# Altium schematic symbol library FPGA_Xilinx_Virtex7.SchLib: 34 symbols (part 15 of 26)
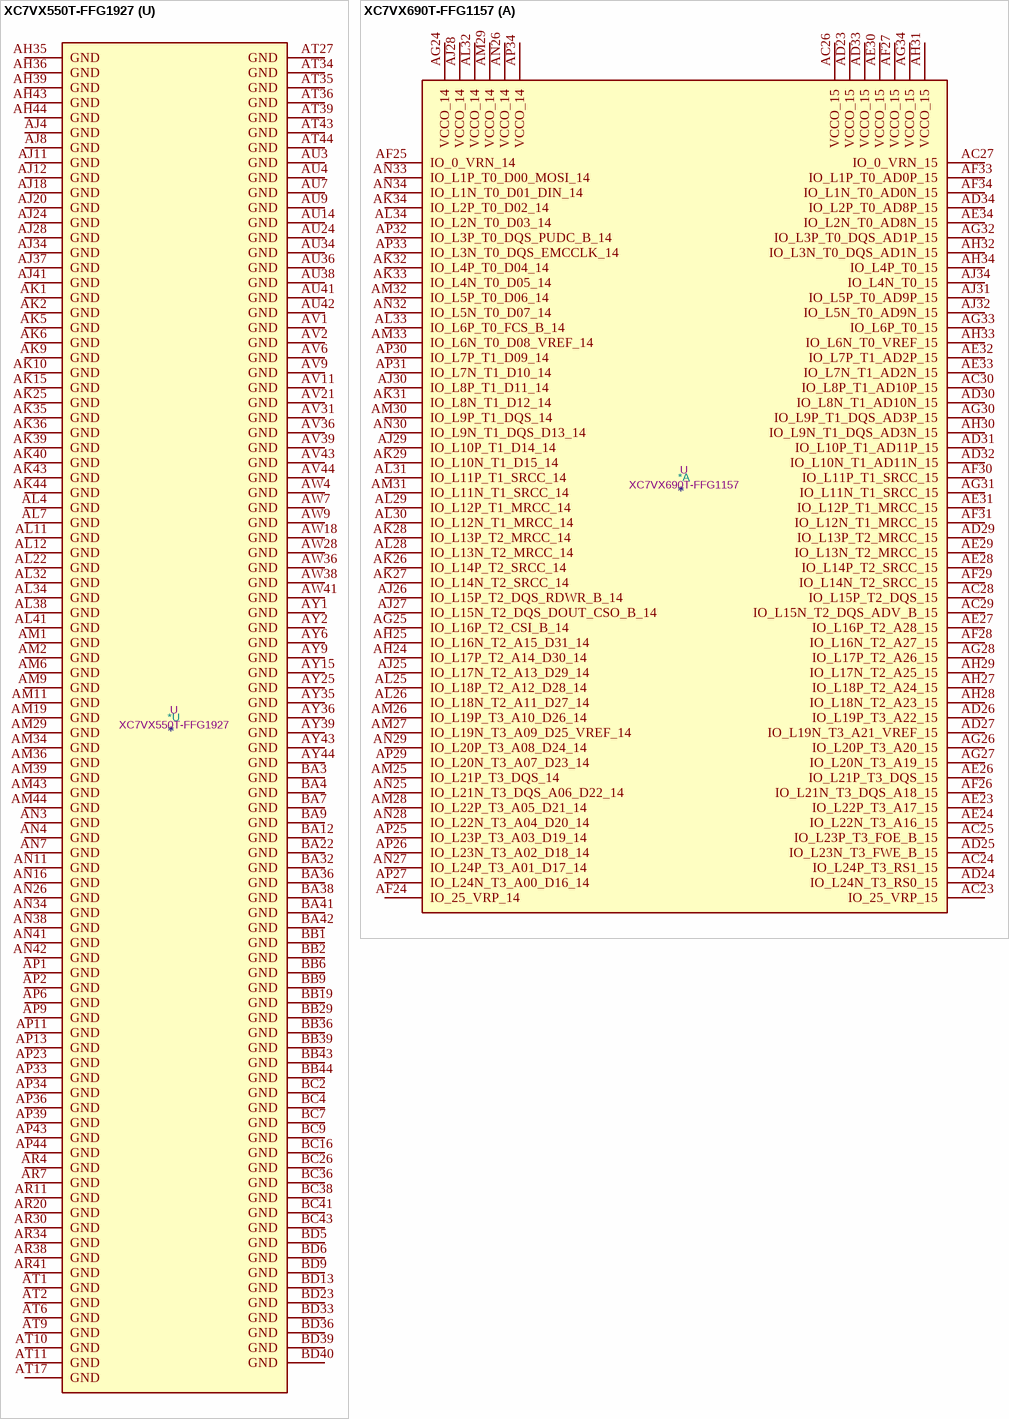
[diagram p186: symbols XC7VX550T-FFG1927 to XC7VX690T-FFG1157]

## XC7VX550T-FFG1927
designator *  value XC7VX550T-FFG1927  Reference: U
ki_keywords: FPGA; ki_description: Virtex 7 XT 550 XC7VX550T-FFG1927
part A pins: AJ23 VCCO_15, AJ25 IO_L24P_T3_RS1_15, AJ26 IO_L24N_T3_RS0_15, AJ29 IO_L23P_T3_A03_D19_14, AK23 IO_L21P_T3_DQS_15, AK24 IO_L21N_T3_DQS_A18_15, AK26 IO_L22P_T3_A17_15, AK27 IO_L21P_T3_DQS_14, AK28 IO_L21N_T3_DQS_A06_D22_14, AK29 IO_L23N_T3_A02_D18_14, AL23 IO_L19P_T3_A22_15, AL24 IO_L23P_T3_FOE_B_15, AL25 IO_L23N_T3_FWE_B_15, AL26 IO_L22N_T3_A16_15, AL27 VCCO_14, AL28 IO_L24P_T3_A01_D17_14, AL29 IO_L24N_T3_A00_D16_14, AM23 IO_L19N_T3_A21_VREF_15, AM24 VCCO_15, AM25 IO_L20P_T3_A20_15, AM26 IO_L20N_T3_A19_15, AM27 IO_L22P_T3_A05_D21_14, AM28 IO_L22N_T3_A04_D20_14, AM30 IO_L20P_T3_A08_D24_14, AN23 IO_L15P_T2_DQS_15, AN24 IO_L15N_T2_DQS_ADV_B_15, AN25 IO_L18P_T2_A24_15, AN27 IO_L15P_T2_DQS_RDWR_B_14, AN28 IO_L19P_T3_A10_D26_14, AN29 IO_L19N_T3_A09_D25_VREF_14, AN30 IO_L20N_T3_A07_D23_14, AP24 IO_L17P_T2_A26_15, AP25 IO_L17N_T2_A25_15, AP26 IO_L18N_T2_A23_15, AP27 IO_L15N_T2_DQS_DOUT_CSO_B_14, AP28 VCCO_14, AP29 IO_L17P_T2_A14_D30_14, AP30 IO_L17N_T2_A13_D29_14, AR24 IO_0_VRN_15, AR25 VCCO_15, AR26 IO_25_VRP_15, AR27 IO_25_VRP_14, AR28 IO_L18P_T2_A12_D28_14, AR29 IO_L18N_T2_A11_D27_14, AT23 IO_L13P_T2_MRCC_15, AT24 IO_L14P_T2_SRCC_15, AT25 IO_L14N_T2_SRCC_15, AT26 IO_L16P_T2_A28_15, AT28 IO_L16P_T2_CSI_B_14, AT29 IO_L16N_T2_A15_D31_14, AT30 IO_0_VRN_14, AU23 IO_L13N_T2_MRCC_15, AU25 IO_L12P_T1_MRCC_15, AU26 IO_L12N_T1_MRCC_15, AU27 IO_L16N_T2_A27_15, AU28 IO_L14P_T2_SRCC_14, AU29 VCCO_14, AU30 IO_L13P_T2_MRCC_14, AV23 IO_L11P_T1_SRCC_15, AV24 IO_L11N_T1_SRCC_15, AV25 IO_L9P_T1_DQS_AD3P_15, AV26 VCCO_15, AV27 IO_L12P_T1_MRCC_14, AV28 IO_L12N_T1_MRCC_14, AV29 IO_L14N_T2_SRCC_14, AV30 IO_L13N_T2_MRCC_14, AW23 VCCO_15, AW24 IO_L10P_T1_AD11P_15, AW25 IO_L9N_T1_DQS_AD3N_15, AW26 IO_L7P_T1_AD2P_15, AW27 IO_L8P_T1_D11_14, AW29 IO_L7P_T1_D09_14, AW30 IO_L11P_T1_SRCC_14, AW31 IO_L11N_T1_SRCC_14, AY23 IO_L8P_T1_AD10P_15, AY24 IO_L10N_T1_AD11N_15, AY26 IO_L7N_T1_AD2N_15, AY27 IO_L8N_T1_D12_14, AY28 IO_L10P_T1_D14_14, AY29 IO_L7N_T1_D10_14, AY30 VCCO_14, AY31 IO_L9P_T1_DQS_14, BA23 IO_L8N_T1_AD10N_15, BA24 IO_L6P_T0_15, BA25 IO_L6N_T0_VREF_15, BA26 IO_L5P_T0_AD9P_15, BA27 VCCO_14, BA28 IO_L10N_T1_D15_14, BA29 IO_L6P_T0_FCS_B_14, BA30 IO_L6N_T0_D08_VREF_14, BA31 IO_L9N_T1_DQS_D13_14, BB23 IO_L2P_T0_AD8P_15, BB24 VCCO_15, BB25 IO_L3P_T0_DQS_AD1P_15, BB26 IO_L5N_T0_AD9N_15, BB27 IO_L3P_T0_DQS_PUDC_B_14, BB28 IO_L3N_T0_DQS_EMCCLK_14, BB30 IO_L4P_T0_D04_14, BC23 IO_L2N_T0_AD8N_15, BC24 IO_L4P_T0_15, BC25 IO_L3N_T0_DQS_AD1N_15, BC27 IO_L1P_T0_D00_MOSI_14, BC28 IO_L5P_T0_D06_14, BC29 IO_L5N_T0_D07_14, BC30 IO_L4N_T0_D05_14, BD24 IO_L4N_T0_15, BD25 IO_L1P_T0_AD0P_15, BD26 IO_L1N_T0_AD0N_15, BD27 IO_L1N_T0_D01_DIN_14, BD28 VCCO_14, BD29 IO_L2P_T0_D02_14, BD30 IO_L2N_T0_D03_14
part B pins: A23 IO_L1N_T0_17, A24 IO_L4P_T0_17, A25 IO_L4N_T0_17, AJ30 IO_L2P_T0_16, AJ31 IO_L2N_T0_16, AJ32 IO_L4P_T0_16, AK30 VCCO_16, AK31 IO_L3P_T0_DQS_16, AK32 IO_L4N_T0_16, AK33 IO_L1P_T0_16, AL30 IO_L5P_T0_16, AL31 IO_L3N_T0_DQS_16, AL33 IO_L1N_T0_16, AM31 IO_L5N_T0_16, AM32 IO_L6P_T0_16, AM33 IO_L6N_T0_VREF_16, AN31 VCCO_16, AN32 IO_L7P_T1_16, AN33 IO_L7N_T1_16, AP31 IO_L9P_T1_DQS_16, AP32 IO_L9N_T1_DQS_16, AR31 IO_L10P_T1_16, AR32 IO_L10N_T1_16, AR33 IO_L8P_T1_16, AT31 IO_25_VRP_16, AT32 VCCO_16, AT33 IO_L8N_T1_16, AU31 IO_L11P_T1_SRCC_16, AU32 IO_L11N_T1_SRCC_16, AU33 IO_L12P_T1_MRCC_16, AU35 IO_0_VRN_16, AV32 IO_L13P_T2_MRCC_16, AV33 IO_L12N_T1_MRCC_16, AV34 IO_L14P_T2_SRCC_16, AV35 IO_L14N_T2_SRCC_16, AW32 IO_L13N_T2_MRCC_16, AW33 VCCO_16, AW34 IO_L15P_T2_DQS_16, AW35 IO_L15N_T2_DQS_16, AY32 IO_L18P_T2_16, AY33 IO_L16P_T2_16, AY34 IO_L16N_T2_16, B23 IO_L1P_T0_17, B24 VCCO_17, B25 IO_L2N_T0_17, BA33 IO_L18N_T2_16, BA34 IO_L17P_T2_16, BA35 IO_L17N_T2_16, BB31 IO_L19P_T3_16, BB32 IO_L19N_T3_VREF_16, BB33 IO_L22P_T3_16, BB34 VCCO_16, BB35 IO_L20P_T3_16, BC31 VCCO_16, BC32 IO_L21P_T3_DQS_16, BC33 IO_L21N_T3_DQS_16, BC34 IO_L22N_T3_16, BC35 IO_L20N_T3_16, BD31 IO_L23P_T3_16, BD32 IO_L23N_T3_16, BD34 IO_L24P_T3_16, BD35 IO_L24N_T3_16, C23 IO_L3P_T0_DQS_17, C24 IO_L3N_T0_DQS_17, C25 IO_L2P_T0_17, D24 IO_L5P_T0_17, D25 IO_L5N_T0_17, E23 IO_L6P_T0_17, E24 IO_L6N_T0_VREF_17, E25 VCCO_17, F23 IO_L7N_T1_17, F24 IO_L8P_T1_17, F25 IO_L8N_T1_17, G23 IO_L7P_T1_17, G25 IO_L10P_T1_17, G26 IO_L10N_T1_17, H23 IO_L9P_T1_DQS_17, H24 IO_L9N_T1_DQS_17, H25 IO_L11N_T1_SRCC_17, H26 VCCO_17, J23 VCCO_17, J24 IO_L11P_T1_SRCC_17, J25 IO_L12P_T1_MRCC_17, J26 IO_L12N_T1_MRCC_17, K23 IO_L13P_T2_MRCC_17, K24 IO_L13N_T2_MRCC_17, K26 IO_L15N_T2_DQS_17, L23 IO_L18N_T2_17, L24 IO_L14P_T2_SRCC_17, L25 IO_L14N_T2_SRCC_17, L26 IO_L15P_T2_DQS_17, M23 IO_L18P_T2_17, M24 VCCO_17, M25 IO_L17N_T2_17, M26 IO_0_VRN_17, N23 IO_L16P_T2_17, N24 IO_L16N_T2_17, N25 IO_L17P_T2_17, P24 IO_25_VRP_17, P25 IO_L20P_T3_17, P26 IO_L20N_T3_17, R23 IO_L24P_T3_17, R24 IO_L24N_T3_17, R25 VCCO_17, R26 IO_L22N_T3_17, T23 IO_L23N_T3_17, T24 IO_L19P_T3_17, T25 IO_L19N_T3_VREF_17, T26 IO_L22P_T3_17, U23 IO_L23P_T3_17, U25 IO_L21P_T3_DQS_17, U26 IO_L21N_T3_DQS_17
part C pins: A26 IO_L5N_T0_19, A27 VCCO_19, A28 IO_L1P_T0_19, A29 IO_L1N_T0_19, A30 IO_L3P_T0_DQS_18, A31 IO_L3N_T0_DQS_18, A33 IO_L2N_T0_18, B26 IO_L5P_T0_19, B27 IO_L3N_T0_DQS_19, B28 IO_L4N_T0_19, B30 IO_L1N_T0_18, B31 IO_L5P_T0_18, B32 IO_L5N_T0_18, B33 IO_L2P_T0_18, C27 IO_L3P_T0_DQS_19, C28 IO_L4P_T0_19, C29 IO_L2N_T0_19, C30 IO_L1P_T0_18, C31 VCCO_18, C32 IO_L4P_T0_18, C33 IO_L4N_T0_18, D26 IO_L6P_T0_19, D27 IO_L6N_T0_VREF_19, D28 VCCO_19, D29 IO_L2P_T0_19, D30 IO_L6P_T0_18, D31 IO_L6N_T0_VREF_18, D32 IO_L7N_T1_18, E26 IO_L8N_T1_19, E27 IO_L10P_T1_19, E28 IO_L10N_T1_19, E29 IO_L9N_T1_DQS_19, E31 IO_L7P_T1_18, E32 IO_L8P_T1_18, E33 IO_L8N_T1_18, F26 IO_L8P_T1_19, F28 IO_L7N_T1_19, F29 IO_L9P_T1_DQS_19, F30 IO_L9P_T1_DQS_18, F31 IO_L9N_T1_DQS_18, F32 VCCO_18, F33 IO_L10N_T1_18, G27 IO_L11N_T1_SRCC_19, G28 IO_L7P_T1_19, G29 VCCO_19, G30 IO_L12N_T1_MRCC_18, G31 IO_L11P_T1_SRCC_18, G32 IO_L11N_T1_SRCC_18, G33 IO_L10P_T1_18, H27 IO_L11P_T1_SRCC_19, H28 IO_L12P_T1_MRCC_19, H29 IO_L12N_T1_MRCC_19, H30 IO_L12P_T1_MRCC_18, H32 IO_L13P_T2_MRCC_18, H33 IO_L13N_T2_MRCC_18, J27 IO_L13N_T2_MRCC_19, J29 IO_L14N_T2_SRCC_19, J30 IO_L14P_T2_SRCC_18, J31 IO_L14N_T2_SRCC_18, J32 IO_L16N_T2_18, J33 VCCO_18, K27 IO_L13P_T2_MRCC_19, K28 IO_L14P_T2_SRCC_19, K29 IO_L16N_T2_19, K30 VCCO_18, K31 IO_L15N_T2_DQS_18, K32 IO_L16P_T2_18, K33 IO_L18N_T2_18, L27 VCCO_19, L28 IO_L16P_T2_19, L29 IO_L18N_T2_19, L30 IO_0_VRN_18, L31 IO_L15P_T2_DQS_18, L33 IO_L18P_T2_18, M27 IO_0_VRN_19, M28 IO_L18P_T2_19, M30 IO_L15N_T2_DQS_19, M31 IO_L17P_T2_18, M32 IO_L17N_T2_18, M33 IO_L20N_T3_18, N27 IO_25_VRP_19, N28 IO_L17P_T2_19, N29 IO_L17N_T2_19, N30 IO_L15P_T2_DQS_19, N31 VCCO_18, N32 IO_L22N_T3_18, N33 IO_L20P_T3_18, P27 IO_L23N_T3_19, P28 VCCO_19, P29 IO_L19P_T3_19, P30 IO_L19N_T3_VREF_19, P31 IO_L22P_T3_18, P32 IO_L19N_T3_VREF_18, R27 IO_L23P_T3_19, R28 IO_L21P_T3_DQS_19, R29 IO_L21N_T3_DQS_19, R31 IO_L21N_T3_DQS_18, R32 IO_L19P_T3_18, R33 IO_L24N_T3_18, T28 IO_L20P_T3_19, T29 IO_L20N_T3_19, T30 IO_L22N_T3_19, T31 IO_L21P_T3_DQS_18, T32 VCCO_18, T33 IO_L24P_T3_18, U27 IO_L24P_T3_19, U28 IO_L24N_T3_19, U29 VCCO_19, U30 IO_L22P_T3_19, U31 IO_25_VRP_18, U32 IO_L23P_T3_18, U33 IO_L23N_T3_18
part D pins: AJ16 IO_L23P_T3_34, AJ21 IO_L20N_T3_35, AJ22 IO_L20P_T3_35, AK16 IO_L23N_T3_34, AK17 IO_25_VRP_34, AK18 IO_L21P_T3_DQS_34, AK19 IO_L24P_T3_35, AK20 VCCO_35, AK21 IO_L22N_T3_35, AK22 IO_L22P_T3_35, AL15 IO_L24N_T3_34, AL16 IO_L24P_T3_34, AL17 VCCO_34, AL18 IO_L21N_T3_DQS_34, AL19 IO_L24N_T3_35, AL20 IO_L23N_T3_35, AL21 IO_L23P_T3_35, AM15 IO_L20P_T3_34, AM16 IO_L22N_T3_34, AM17 IO_L22P_T3_34, AM18 IO_L19P_T3_34, AM20 IO_L21P_T3_DQS_35, AM21 IO_L19N_T3_VREF_35, AM22 IO_L19P_T3_35, AN15 IO_L20N_T3_34, AN17 IO_L18P_T2_34, AN18 IO_L19N_T3_VREF_34, AN19 IO_L21N_T3_DQS_35, AN20 IO_L17P_T2_35, AN21 VCCO_35, AN22 IO_L18P_T2_35, AP15 IO_0_VRN_34, AP16 IO_L15P_T2_DQS_34, AP17 IO_L18N_T2_34, AP18 VCCO_34, AP19 IO_L17N_T2_35, AP20 IO_L15N_T2_DQS_35, AP21 IO_L15P_T2_DQS_35, AP22 IO_L18N_T2_35, AR15 VCCO_34, AR16 IO_L15N_T2_DQS_34, AR17 IO_L16N_T2_34, AR18 IO_L16P_T2_34, AR19 IO_25_VRP_35, AR21 IO_L16N_T2_35, AR22 IO_L16P_T2_35, AR23 IO_0_VRN_35, AT15 IO_L17N_T2_34, AT16 IO_L17P_T2_34, AT18 IO_L13P_T2_MRCC_34, AT19 IO_L14N_T2_SRCC_35, AT20 IO_L14P_T2_SRCC_35, AT21 IO_L13P_T2_MRCC_35, AT22 VCCO_35, AU15 IO_L12P_T1_MRCC_34, AU16 IO_L14N_T2_SRCC_34, AU17 IO_L14P_T2_SRCC_34, AU18 IO_L13N_T2_MRCC_34, AU19 VCCO_35, AU20 IO_L12P_T1_MRCC_35, AU21 IO_L13N_T2_MRCC_35, AU22 IO_L11P_T1_SRCC_35, AV15 IO_L12N_T1_MRCC_34, AV16 VCCO_34, AV17 IO_L11N_T1_SRCC_34, AV18 IO_L11P_T1_SRCC_34, AV19 IO_L12N_T1_MRCC_35, AV20 IO_L8P_T1_AD14P_35, AV22 IO_L11N_T1_SRCC_35, AW15 IO_L9N_T1_DQS_34, AW16 IO_L9P_T1_DQS_34, AW17 IO_L7P_T1_34, AW19 IO_L10P_T1_AD15P_35, AW20 IO_L8N_T1_AD14N_35, AW21 IO_L9P_T1_DQS_AD7P_35, AW22 IO_L7P_T1_AD6P_35, AY16 IO_L7N_T1_34, AY17 IO_L8N_T1_34, AY18 IO_L8P_T1_34, AY19 IO_L10N_T1_AD15N_35, AY20 VCCO_35, AY21 IO_L9N_T1_DQS_AD7N_35, AY22 IO_L7N_T1_AD6N_35, BA15 IO_L10N_T1_34, BA16 IO_L10P_T1_34, BA17 VCCO_34, BA18 IO_L1P_T0_34, BA19 IO_L6N_T0_VREF_35, BA20 IO_L6P_T0_35, BA21 IO_L5P_T0_AD13P_35, BB15 IO_L6N_T0_VREF_34, BB16 IO_L6P_T0_34, BB17 IO_L3P_T0_DQS_34, BB18 IO_L1N_T0_34, BB20 IO_L5N_T0_AD13N_35, BB21 IO_L1N_T0_AD4N_35, BB22 IO_L1P_T0_AD4P_35, BC15 IO_L5P_T0_34, BC17 IO_L3N_T0_DQS_34, BC18 IO_L2N_T0_34, BC19 IO_L2P_T0_34, BC20 IO_L3P_T0_DQS_AD5P_35, BC21 VCCO_35, BC22 IO_L2P_T0_AD12P_35, BD15 IO_L5N_T0_34, BD16 IO_L4N_T0_34, BD17 IO_L4P_T0_34, BD18 VCCO_34, BD19 IO_L3N_T0_DQS_AD5N_35, BD20 IO_L4N_T0_35, BD21 IO_L4P_T0_35, BD22 IO_L2N_T0_AD12N_35
part E pins: A20 IO_L2N_T0_37, A21 IO_L1N_T0_37, AJ13 VCCO_36, AJ14 IO_L1P_T0_36, AK12 IO_L3N_T0_DQS_36, AK13 IO_L3P_T0_DQS_36, AK14 IO_L1N_T0_36, AL13 IO_L5N_T0_36, AL14 IO_L5P_T0_36, AM12 IO_L2N_T0_36, AM13 IO_L2P_T0_36, AM14 VCCO_36, AN12 IO_L4N_T0_36, AN13 IO_L4P_T0_36, AN14 IO_L6P_T0_36, AP12 IO_0_VRN_36, AP14 IO_L6N_T0_VREF_36, AR12 IO_L7N_T1_36, AR13 IO_L7P_T1_36, AR14 IO_25_VRP_36, AT12 VCCO_36, AT13 IO_L9N_T1_DQS_36, AT14 IO_L9P_T1_DQS_36, AU10 IO_L10P_T1_36, AU11 IO_L8N_T1_36, AU12 IO_L8P_T1_36, AU13 IO_L12P_T1_MRCC_36, AV10 IO_L10N_T1_36, AV12 IO_L11P_T1_SRCC_36, AV13 IO_L12N_T1_MRCC_36, AV14 IO_L13P_T2_MRCC_36, AW10 IO_L14N_T2_SRCC_36, AW11 IO_L14P_T2_SRCC_36, AW12 IO_L11N_T1_SRCC_36, AW13 VCCO_36, AW14 IO_L13N_T2_MRCC_36, AY10 VCCO_36, AY11 IO_L16N_T2_36, AY12 IO_L16P_T2_36, AY13 IO_L15P_T2_DQS_36, AY14 IO_L18P_T2_36, B20 IO_L2P_T0_37, B21 IO_L1P_T0_37, B22 IO_L3N_T0_DQS_37, BA10 IO_L17N_T2_36, BA11 IO_L17P_T2_36, BA13 IO_L15N_T2_DQS_36, BA14 IO_L18N_T2_36, BB10 IO_L19N_T3_VREF_36, BB11 IO_L19P_T3_36, BB12 IO_L20P_T3_36, BB13 IO_L22P_T3_36, BB14 VCCO_36, BC10 IO_L24P_T3_36, BC11 VCCO_36, BC12 IO_L20N_T3_36, BC13 IO_L22N_T3_36, BC14 IO_L23P_T3_36, BD10 IO_L24N_T3_36, BD11 IO_L21N_T3_DQS_36, BD12 IO_L21P_T3_DQS_36, BD14 IO_L23N_T3_36, C20 IO_L4N_T0_37, C21 VCCO_37, C22 IO_L3P_T0_DQS_37, D20 IO_L4P_T0_37, D21 IO_L5N_T0_37, D22 IO_L5P_T0_37, E21 IO_L6N_T0_VREF_37, E22 IO_L6P_T0_37, F19 IO_L8N_T1_37, F20 IO_L8P_T1_37, F21 IO_L7N_T1_37, F22 VCCO_37, G19 VCCO_37, G20 IO_L12N_T1_MRCC_37, G21 IO_L7P_T1_37, G22 IO_L9N_T1_DQS_37, H19 IO_L10N_T1_37, H20 IO_L12P_T1_MRCC_37, H22 IO_L9P_T1_DQS_37, J19 IO_L10P_T1_37, J20 IO_L11N_T1_SRCC_37, J21 IO_L11P_T1_SRCC_37, J22 IO_L13N_T2_MRCC_37, K19 IO_L15N_T2_DQS_37, K20 VCCO_37, K21 IO_L14N_T2_SRCC_37, K22 IO_L13P_T2_MRCC_37, L19 IO_L15P_T2_DQS_37, L20 IO_L16N_T2_37, L21 IO_L14P_T2_SRCC_37, M20 IO_L16P_T2_37, M21 IO_25_VRP_37, M22 IO_L18N_T2_37, N19 IO_L17N_T2_37, N20 IO_L17P_T2_37, N21 VCCO_37, N22 IO_L18P_T2_37, P19 IO_0_VRN_37, P20 IO_L22N_T3_37, P21 IO_L22P_T3_37, P22 IO_L23N_T3_37, R19 IO_L20N_T3_37, R21 IO_L24N_T3_37, R22 IO_L23P_T3_37, T19 IO_L20P_T3_37, T20 IO_L19N_T3_VREF_37, T21 IO_L24P_T3_37, T22 VCCO_37, U19 VCCO_37, U20 IO_L19P_T3_37, U21 IO_L21N_T3_DQS_37, U22 IO_L21P_T3_DQS_37
part F pins: A13 IO_L4N_T0_38, A14 IO_L4P_T0_38, A15 IO_L2N_T0_38, A16 IO_L2N_T0_39, A17 VCCO_39, A18 IO_L5N_T0_39, A19 IO_L5P_T0_39, B12 IO_L3N_T0_DQS_38, B13 IO_L3P_T0_DQS_38, B14 VCCO_38, B15 IO_L2P_T0_38, B16 IO_L2P_T0_39, B17 IO_L4N_T0_39, B18 IO_L1N_T0_39, C12 IO_L5N_T0_38, C13 IO_L5P_T0_38, C14 IO_L1N_T0_38, C15 IO_L1P_T0_38, C17 IO_L4P_T0_39, C18 IO_L1P_T0_39, C19 IO_L3N_T0_DQS_39, D12 IO_L7N_T1_38, D14 IO_L6N_T0_VREF_38, D15 IO_L6P_T0_38, D16 IO_L6N_T0_VREF_39, D17 IO_L6P_T0_39, D18 VCCO_39, D19 IO_L3P_T0_DQS_39, E12 IO_L7P_T1_38, E13 IO_L8N_T1_38, E14 IO_L8P_T1_38, E15 VCCO_38, E16 IO_L7N_T1_39, E17 IO_L7P_T1_39, E18 IO_L10N_T1_39, E19 IO_L10P_T1_39, F12 VCCO_38, F13 IO_L10N_T1_38, F14 IO_L10P_T1_38, F15 IO_L9N_T1_DQS_38, F16 IO_L9N_T1_DQS_39, F18 IO_L8N_T1_39, G12 IO_L15N_T2_DQS_38, G13 IO_L11N_T1_SRCC_38, G15 IO_L9P_T1_DQS_38, G16 IO_L9P_T1_DQS_39, G17 IO_L12N_T1_MRCC_39, G18 IO_L8P_T1_39, H12 IO_L15P_T2_DQS_38, H13 IO_L11P_T1_SRCC_38, H14 IO_L12N_T1_MRCC_38, H15 IO_L12P_T1_MRCC_38, H16 VCCO_39, H17 IO_L11N_T1_SRCC_39, H18 IO_L12P_T1_MRCC_39, J12 IO_L18N_T2_38, J13 VCCO_38, J14 IO_L13N_T2_MRCC_38, J15 IO_L13P_T2_MRCC_38, J16 IO_L13N_T2_MRCC_39, J17 IO_L11P_T1_SRCC_39, K12 IO_L18P_T2_38, K13 IO_L14N_T2_SRCC_38, K14 IO_L14P_T2_SRCC_38, K16 IO_L14N_T2_SRCC_39, K17 IO_L13P_T2_MRCC_39, K18 IO_0_VRN_39, L13 IO_L16N_T2_38, L14 IO_L17N_T2_38, L15 IO_0_VRN_38, L16 IO_L14P_T2_SRCC_39, L17 VCCO_39, L18 IO_L16N_T2_39, M12 IO_L22N_T3_38, M13 IO_L16P_T2_38, M14 VCCO_38, M15 IO_L17P_T2_38, M16 IO_L18N_T2_39, M17 IO_L18P_T2_39, M18 IO_L16P_T2_39, N12 IO_L22P_T3_38, N13 IO_L20N_T3_38, N14 IO_L20P_T3_38, N15 IO_L17N_T2_39, N17 IO_L15N_T2_DQS_39, N18 IO_25_VRP_39, P12 IO_L24N_T3_38, P14 IO_L19N_T3_VREF_38, P15 IO_L17P_T2_39, P16 IO_L20N_T3_39, P17 IO_L15P_T2_DQS_39, P18 VCCO_39, R12 IO_L24P_T3_38, R13 IO_L21N_T3_DQS_38, R14 IO_L19P_T3_38, R15 VCCO_39, R16 IO_L20P_T3_39, R17 IO_L22N_T3_39, R18 IO_L22P_T3_39, T12 VCCO_38, T13 IO_L23N_T3_38, T14 IO_L21P_T3_DQS_38, T15 IO_L19N_T3_VREF_39, T16 IO_L19P_T3_39, T18 IO_L23N_T3_39, U12 IO_25_VRP_38, U13 IO_L23P_T3_38, U15 IO_L24N_T3_39, U16 IO_L21N_T3_DQS_39, U17 IO_L21P_T3_DQS_39, U18 IO_L23P_T3_39, V15 IO_L24P_T3_39, V16 VCCO_39
part G pins: AP7 MGTHRXN3_111, AP8 MGTHRXP3_111, AR5 MGTHRXN2_111, AR6 MGTHRXP2_111, AR9 MGTREFCLK0N_111, AR10 MGTREFCLK0P_111, AT3 MGTHTXN3_111, AT4 MGTHTXP3_111, AT7 MGTREFCLK1N_111, AT8 MGTREFCLK1P_111, AU1 MGTHTXN2_111, AU2 MGTHTXP2_111, AU5 MGTHRXN1_111, AU6 MGTHRXP1_111, AV3 MGTHTXN1_111, AV4 MGTHTXP1_111, AV7 MGTHRXN0_111, AV8 MGTHRXP0_111, AW1 MGTHTXN0_111, AW2 MGTHTXP0_111, AW5 MGTHRXN3_110, AW6 MGTHRXP3_110, AY3 MGTHTXN3_110, AY4 MGTHTXP3_110, AY7 MGTREFCLK0N_110, AY8 MGTREFCLK0P_110, BA1 MGTHTXN2_110, BA2 MGTHTXP2_110, BA5 MGTHRXN2_110, BA6 MGTHRXP2_110, BB3 MGTHTXN1_110, BB4 MGTHTXP1_110, BB7 MGTREFCLK1N_110, BB8 MGTREFCLK1P_110, BC5 MGTHRXN1_110, BC6 MGTHRXP1_110, BD3 MGTHTXN0_110, BD4 MGTHTXP0_110, BD7 MGTHRXN0_110, BD8 MGTHRXP0_110
part H pins: AE5 MGTHRXN3_113, AE6 MGTHRXP3_113, AF7 MGTREFCLK0N_113, AF8 MGTREFCLK0P_113, AG1 MGTHTXN3_113, AG2 MGTHTXP3_113, AG5 MGTHRXN2_113, AG6 MGTHRXP2_113, AH3 MGTHTXN2_113, AH4 MGTHTXP2_113, AH7 MGTREFCLK1N_113, AH8 MGTREFCLK1P_113, AJ1 MGTHTXN1_113, AJ2 MGTHTXP1_113, AJ5 MGTHRXN1_113, AJ6 MGTHRXP1_113, AK3 MGTHTXN0_113, AK4 MGTHTXP0_113, AK7 MGTHRXN0_113, AK8 MGTHRXP0_113, AL1 MGTHTXN3_112, AL2 MGTHTXP3_112, AL5 MGTHRXN3_112, AL6 MGTHRXP3_112, AL9 MGTREFCLK0N_112, AL10 MGTREFCLK0P_112, AM3 MGTHRXN1_112, AM4 MGTHRXP1_112, AM7 MGTHRXN2_112, AM8 MGTHRXP2_112, AN1 MGTHTXN2_112, AN2 MGTHTXP2_112, AN5 MGTHRXN0_112, AN6 MGTHRXP0_112, AN9 MGTREFCLK1N_112, AN10 MGTREFCLK1P_112, AP3 MGTHTXN1_112, AP4 MGTHTXP1_112, AR1 MGTHTXN0_112, AR2 MGTHTXP0_112
part I pins: AA1 MGTHTXN1_115, AA2 MGTHTXP1_115, AA5 MGTHRXN2_114, AA6 MGTHRXP2_114, AA9 MGTREFCLK0N_114, AA10 MGTREFCLK0P_114, AB3 MGTHTXN0_115, AB4 MGTHTXP0_115, AB7 MGTREFCLK1N_114, AB8 MGTREFCLK1P_114, AC1 MGTHTXN3_114, AC2 MGTHTXP3_114, AC5 MGTHRXN1_114, AC6 MGTHRXP1_114, AD3 MGTHTXN2_114, AD4 MGTHTXP2_114, AD7 MGTHRXN0_114, AD8 MGTHRXP0_114, AE1 MGTHTXN1_114, AE2 MGTHTXP1_114, AF3 MGTHTXN0_114, AF4 MGTHTXP0_114, T7 MGTHRXN3_115, T8 MGTHRXP3_115, U5 MGTHRXN2_115, U6 MGTHRXP2_115, U9 MGTREFCLK0N_115, U10 MGTREFCLK0P_115, V7 MGTHRXN1_115, V8 MGTHRXP1_115, W1 MGTHTXN3_115, W2 MGTHTXP3_115, W5 MGTHRXN0_115, W6 MGTHRXP0_115, W9 MGTREFCLK1N_115, W10 MGTREFCLK1P_115, Y3 MGTHTXN2_115, Y4 MGTHTXP2_115, Y7 MGTHRXN3_114, Y8 MGTHRXP3_114
part J pins: H7 MGTHRXN3_117, H8 MGTHRXP3_117, J5 MGTHRXN2_117, J6 MGTHRXP2_117, J9 MGTREFCLK0N_117, J10 MGTREFCLK0P_117, K7 MGTHRXN1_117, K8 MGTHRXP1_117, L1 MGTHTXN3_117, L2 MGTHTXP3_117, L5 MGTHRXN0_117, L6 MGTHRXP0_117, L9 MGTREFCLK1N_117, L10 MGTREFCLK1P_117, M3 MGTHTXN2_117, M4 MGTHTXP2_117, M7 MGTHRXN3_116, M8 MGTHRXP3_116, N1 MGTHTXN1_117, N2 MGTHTXP1_117, N5 MGTHRXN2_116, N6 MGTHRXP2_116, N9 MGTREFCLK0N_116, N10 MGTREFCLK0P_116, P3 MGTHTXN0_117, P4 MGTHTXP0_117, P7 MGTHRXN1_116, P8 MGTHRXP1_116, R1 MGTHTXN3_116, R2 MGTHTXP3_116, R5 MGTHRXN0_116, R6 MGTHRXP0_116, R9 MGTREFCLK1N_116, R10 MGTREFCLK1P_116, T3 MGTHTXN2_116, T4 MGTHTXP2_116, U1 MGTHTXN1_116, U2 MGTHTXP1_116, V3 MGTHTXN0_116, V4 MGTHTXP0_116
part K pins: A5 MGTHRXN3_119, A6 MGTHRXP3_119, A9 MGTREFCLK0N_119, A10 MGTREFCLK0P_119, B3 MGTHTXN3_119, B4 MGTHTXP3_119, B7 MGTHRXN2_119, B8 MGTHRXP2_119, C1 MGTHTXN2_119, C2 MGTHTXP2_119, C5 MGTHRXN1_119, C6 MGTHRXP1_119, C9 MGTREFCLK1N_119, C10 MGTREFCLK1P_119, D3 MGTHRXN0_119, D4 MGTHRXP0_119, D7 MGTHRXN3_118, D8 MGTHRXP3_118, E1 MGTHTXN1_119, E2 MGTHTXP1_119, E5 MGTHRXN2_118, E6 MGTHRXP2_118, E9 MGTREFCLK0N_118, E10 MGTREFCLK0P_118, F3 MGTHTXN0_119, F4 MGTHTXP0_119, F7 MGTHRXN1_118, F8 MGTHRXP1_118, G1 MGTHTXN3_118, G2 MGTHTXP3_118, G5 MGTHRXN0_118, G6 MGTHRXP0_118, G9 MGTREFCLK1N_118, G10 MGTREFCLK1P_118, H3 MGTHTXN2_118, H4 MGTHTXP2_118, J1 MGTHTXN1_118, J2 MGTHTXP1_118, K3 MGTHTXN0_118, K4 MGTHTXP0_118
part L pins: AP37 MGTHRXP3_211, AP38 MGTHRXN3_211, AR35 MGTREFCLK0P_211, AR36 MGTREFCLK0N_211, AR39 MGTHRXP2_211, AR40 MGTHRXN2_211, AT37 MGTREFCLK1P_211, AT38 MGTREFCLK1N_211, AT41 MGTHTXP3_211, AT42 MGTHTXN3_211, AU39 MGTHRXP1_211, AU40 MGTHRXN1_211, AU43 MGTHTXP2_211, AU44 MGTHTXN2_211, AV37 MGTHRXP0_211, AV38 MGTHRXN0_211, AV41 MGTHTXP1_211, AV42 MGTHTXN1_211, AW39 MGTHRXP3_210, AW40 MGTHRXN3_210, AW43 MGTHTXP0_211, AW44 MGTHTXN0_211, AY37 MGTREFCLK0P_210, AY38 MGTREFCLK0N_210, AY41 MGTHTXP3_210, AY42 MGTHTXN3_210, BA39 MGTHRXP2_210, BA40 MGTHRXN2_210, BA43 MGTHTXP2_210, BA44 MGTHTXN2_210, BB37 MGTREFCLK1P_210, BB38 MGTREFCLK1N_210, BB41 MGTHTXP1_210, BB42 MGTHTXN1_210, BC39 MGTHRXP1_210, BC40 MGTHRXN1_210, BD37 MGTHRXP0_210, BD38 MGTHRXN0_210, BD41 MGTHTXP0_210, BD42 MGTHTXN0_210
part M pins: AE39 MGTHRXP3_213, AE40 MGTHRXN3_213, AF37 MGTREFCLK0P_213, AF38 MGTREFCLK0N_213, AG39 MGTHRXP2_213, AG40 MGTHRXN2_213, AG43 MGTHTXP3_213, AG44 MGTHTXN3_213, AH37 MGTREFCLK1P_213, AH38 MGTREFCLK1N_213, AH41 MGTHTXP2_213, AH42 MGTHTXN2_213, AJ39 MGTHRXP1_213, AJ40 MGTHRXN1_213, AJ43 MGTHTXP1_213, AJ44 MGTHTXN1_213, AK37 MGTHRXP0_213, AK38 MGTHRXN0_213, AK41 MGTHTXP0_213, AK42 MGTHTXN0_213, AL35 MGTREFCLK0P_212, AL36 MGTREFCLK0N_212, AL39 MGTHRXP3_212, AL40 MGTHRXN3_212, AL43 MGTHTXP3_212, AL44 MGTHTXN3_212, AM37 MGTHRXP2_212, AM38 MGTHRXN2_212, AM41 MGTHRXP1_212, AM42 MGTHRXN1_212, AN35 MGTREFCLK1P_212, AN36 MGTREFCLK1N_212, AN39 MGTHRXP0_212, AN40 MGTHRXN0_212, AN43 MGTHTXP2_212, AN44 MGTHTXN2_212, AP41 MGTHTXP1_212, AP42 MGTHTXN1_212, AR43 MGTHTXP0_212, AR44 MGTHTXN0_212
part N pins: AA35 MGTREFCLK0P_214, AA36 MGTREFCLK0N_214, AA39 MGTHRXP2_214, AA40 MGTHRXN2_214, AA43 MGTHTXP1_215, AA44 MGTHTXN1_215, AB37 MGTREFCLK1P_214, AB38 MGTREFCLK1N_214, AB41 MGTHTXP0_215, AB42 MGTHTXN0_215, AC39 MGTHRXP1_214, AC40 MGTHRXN1_214, AC43 MGTHTXP3_214, AC44 MGTHTXN3_214, AD37 MGTHRXP0_214, AD38 MGTHRXN0_214, AD41 MGTHTXP2_214, AD42 MGTHTXN2_214, AE43 MGTHTXP1_214, AE44 MGTHTXN1_214, AF41 MGTHTXP0_214, AF42 MGTHTXN0_214, T37 MGTHRXP3_215, T38 MGTHRXN3_215, U35 MGTREFCLK0P_215, U36 MGTREFCLK0N_215, U39 MGTHRXP2_215, U40 MGTHRXN2_215, V37 MGTHRXP1_215, V38 MGTHRXN1_215, W35 MGTREFCLK1P_215, W36 MGTREFCLK1N_215, W39 MGTHRXP0_215, W40 MGTHRXN0_215, W43 MGTHTXP3_215, W44 MGTHTXN3_215, Y37 MGTHRXP3_214, Y38 MGTHRXN3_214, Y41 MGTHTXP2_215, Y42 MGTHTXN2_215